# Altium footprint library NXP_60_26022015.PCBLIB: 287 footprints (part 18 of 18)
Each footprint in its own frame and in the unit in brackets; x right, y up, seen from the top. Pads: shape width x height; smd on the part's side, far side on the other; paste and mask are expansions set on the pad; w line width, h text height; cw(c..) or ccw(c..) is an arc to the next point about the centre after c.
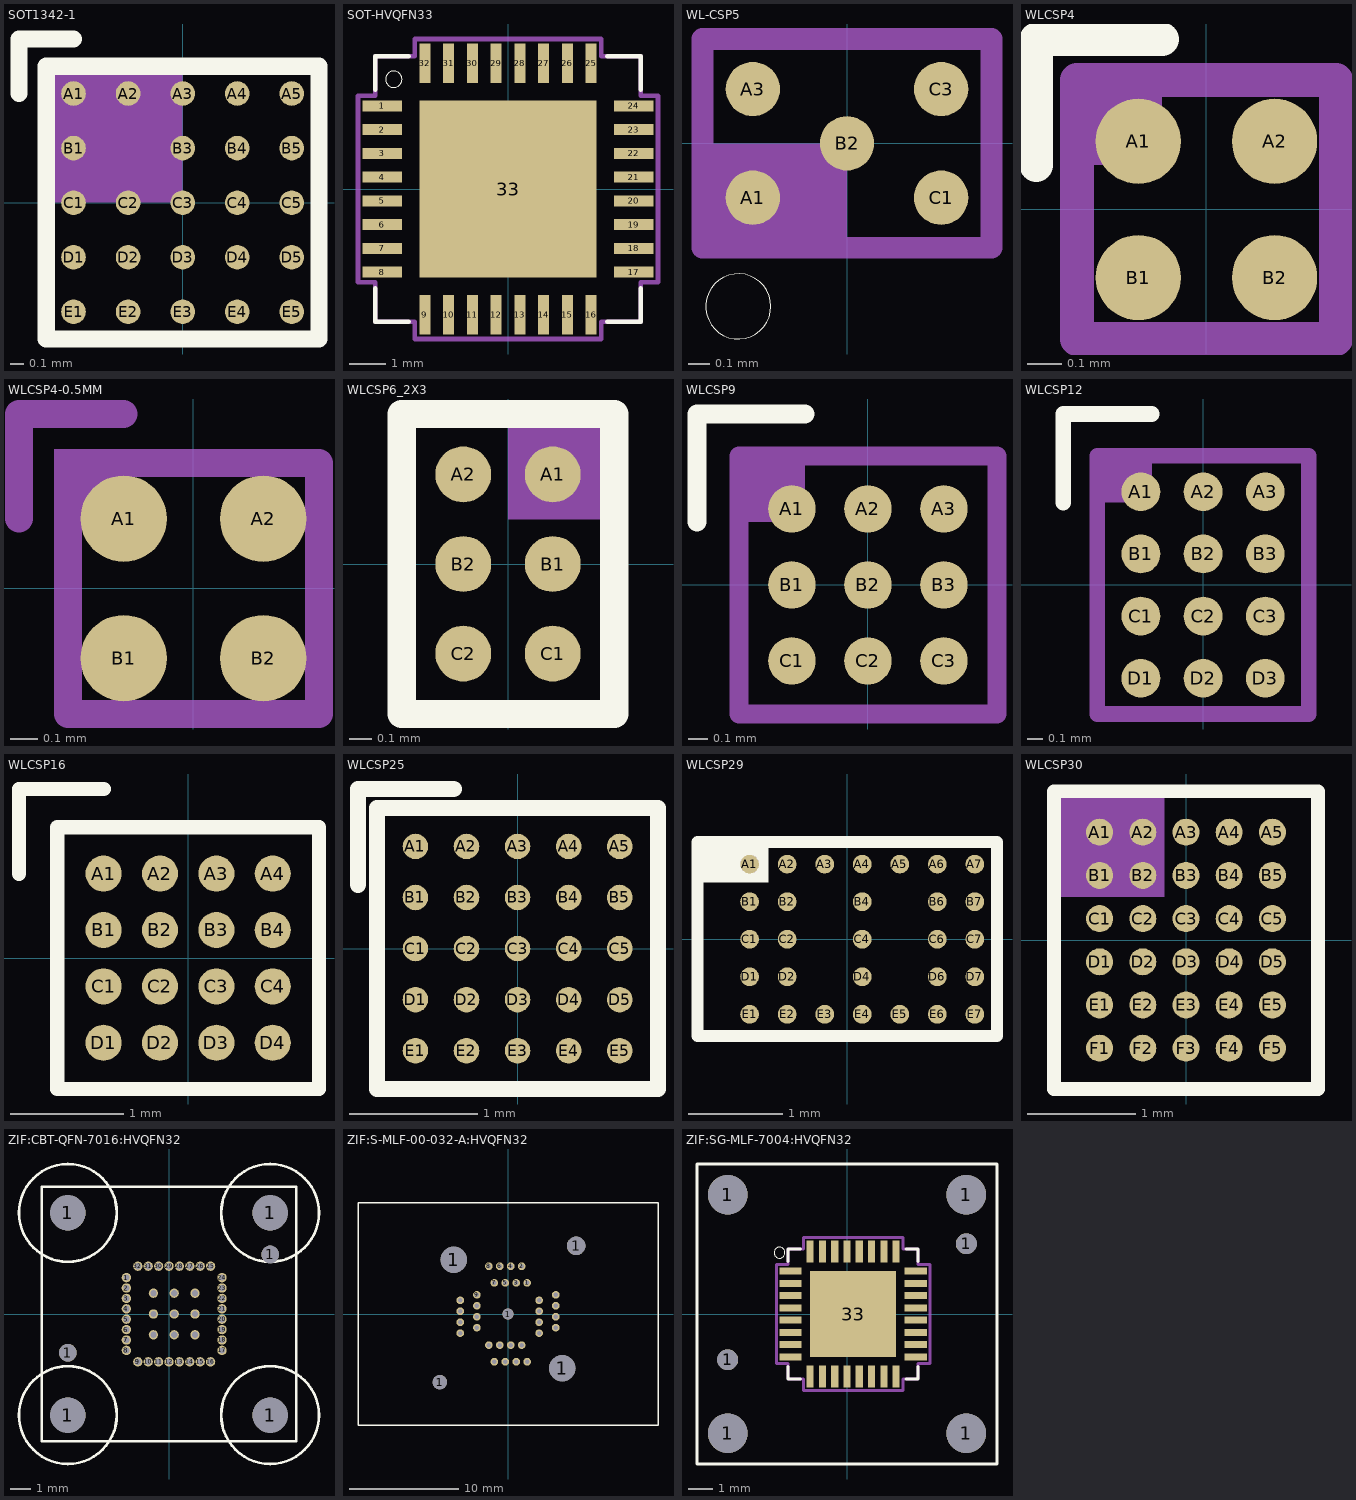
[diagram p17: the footprints below, top view; thin cyan lines are the x and y axes]

## SOT1342-1 [mil]
pads (24):
  rrect100% 7.09x7.09 smd: A1(-31.5,31.5) A2(-15.75,31.5) A3(0,31.5) A4(15.75,31.5) A5(31.5,31.5) B1(-31.5,15.75) B3(0,15.75) B4(15.75,15.75) B5(31.5,15.75) C1(-31.5,0) C2(-15.75,0) C3(0,0) C4(15.75,0) C5(31.5,0) D1(-31.5,-15.75) D2(-15.75,-15.75) D3(0,-15.75) D4(15.75,-15.75) D5(31.5,-15.75) E1(-31.5,-31.5) E2(-15.75,-31.5) E3(0,-31.5) E4(15.75,-31.5) E5(31.5,-31.5)
Top Overlay:
  lines w5: -47.24,31.5 -47.24,47.24 -31.5,47.24 ; -39.37,-39.37 39.37,-39.37 39.37,39.37 -39.37,39.37 -39.37,-39.37
Top Paste:
  circle w0: c-31.5,31.5 r3.94
  circle w0: c-31.5,15.75 r3.94
  circle w0: c-31.5,0 r3.94
  circle w0: c-31.5,-15.75 r3.94
  circle w0: c-31.5,-31.5 r3.94
  circle w0: c-15.75,31.5 r3.94
  circle w0: c-15.75,0 r3.94
  circle w0: c-15.75,-15.75 r3.94
  circle w0: c-15.75,-31.5 r3.94
  circle w0: c0,31.5 r3.94
  circle w0: c0,15.75 r3.94
  circle w0: c0,0 r3.94
  circle w0: c0,-15.75 r3.94
  circle w0: c0,-31.5 r3.94
  circle w0: c15.75,31.5 r3.94
  circle w0: c15.75,15.75 r3.94
  circle w0: c15.75,0 r3.94
  circle w0: c15.75,-15.75 r3.94
  circle w0: c15.75,-31.5 r3.94
  circle w0: c31.5,31.5 r3.94
  circle w0: c31.5,15.75 r3.94
  circle w0: c31.5,0 r3.94
  circle w0: c31.5,-15.75 r3.94
  circle w0: c31.5,-31.5 r3.94
Top Solder:
  circle w0: c-31.5,31.5 r4.92
  circle w0: c-31.5,15.75 r4.92
  circle w0: c-31.5,0 r4.92
  circle w0: c-31.5,-15.75 r4.92
  circle w0: c-31.5,-31.5 r4.92
  circle w0: c-15.75,31.5 r4.92
  circle w0: c-15.75,0 r4.92
  circle w0: c-15.75,-15.75 r4.92
  circle w0: c-15.75,-31.5 r4.92
  circle w0: c0,31.5 r4.92
  circle w0: c0,15.75 r4.92
  circle w0: c0,0 r4.92
  circle w0: c0,-15.75 r4.92
  circle w0: c0,-31.5 r4.92
  circle w0: c15.75,31.5 r4.92
  circle w0: c15.75,15.75 r4.92
  circle w0: c15.75,0 r4.92
  circle w0: c15.75,-15.75 r4.92
  circle w0: c15.75,-31.5 r4.92
  circle w0: c31.5,31.5 r4.92
  circle w0: c31.5,15.75 r4.92
  circle w0: c31.5,0 r4.92
  circle w0: c31.5,-15.75 r4.92
  circle w0: c31.5,-31.5 r4.92
Mechanical 16:
  rectangle: -39.37,0 0,39.37

## SOT-HVQFN33 [mm]
pads (33):
  rect 1.075x0.3 smd: 1(-3.437,2.275) 2(-3.437,1.625) 3(-3.437,0.975) 4(-3.437,0.325) 5(-3.437,-0.325) 6(-3.437,-0.975) 7(-3.437,-1.625) 8(-3.437,-2.275) 17(3.437,-2.275) 18(3.437,-1.625) 19(3.437,-0.975) 20(3.437,-0.325) 21(3.437,0.325) 22(3.437,0.975) 23(3.437,1.625) 24(3.437,2.275)
  rect 0.3x1.075 smd: 9(-2.275,-3.437) 10(-1.625,-3.437) 11(-0.975,-3.437) 12(-0.325,-3.437) 13(0.325,-3.437) 14(0.975,-3.437) 15(1.625,-3.437) 16(2.275,-3.437) 25(2.275,3.437) 26(1.625,3.437) 27(0.975,3.437) 28(0.325,3.437) 29(-0.325,3.437) 30(-0.975,3.437) 31(-1.625,3.437) 32(-2.275,3.437)
  rect 4.85x4.85 smd: 33(0,0)
Top Overlay:
  circle w0: c-3.12,3 r0.224
  lines w0.127: -3.625,-2.712 -3.625,-3.625 -2.712,-3.625 ; -3.625,2.712 -3.625,3.625 -2.712,3.625 ; 2.712,-3.625 3.625,-3.625 3.625,-2.712 ; 2.712,3.625 3.625,3.625 3.625,2.712
Top Paste:
  rectangle: 0.35,0.35 1.35,1.35
  rectangle: 0.35,-1.35 1.35,-0.35
  rectangle: -1.35,-1.35 -0.35,-0.35
  rectangle: -1.35,0.35 -0.35,1.35
Top Solder:
  rectangle: -2.525,-2.525 2.525,2.525
Mechanical 16:
  lines w0.127: -4.1,-2.55 -4.1,2.55 -3.625,2.55 -3.625,3.625 -2.55,3.625 -2.55,4.1 2.55,4.1 2.55,3.625 3.625,3.625 3.625,2.55 4.1,2.55 4.1,-2.55 3.625,-2.55 3.625,-3.625 2.55,-3.625 2.55,-4.1 -2.55,-4.1 -2.55,-3.625 -3.625,-3.625 -3.625,-2.55 -4.1,-2.55

## WL-CSP5 [mm]
pads (5):
  rrect100% 0.25x0.25 smd: A1(-0.433,-0.25) A3(-0.433,0.25) B2(0,0) C1(0.433,-0.25) C3(0.433,0.25)
Top Overlay:
  circle w0: c-0.5,-0.75 r0.15
Mechanical 16:
  rectangle: -0.665,-0.48 0,0
  lines w0.1: -0.665,-0.48 0.665,-0.48 0.665,0.48 -0.665,0.48 -0.665,-0.48

## WLCSP4 [mm]
pads (4):
  rrect100% 0.25x0.25 smd: A1(-0.2,0.2) A2(0.2,0.2) B1(-0.2,-0.2) B2(0.2,-0.2)
Top Overlay:
  lines w0.1: -0.5,0.13 -0.5,0.5 -0.13,0.5
Top Solder:
  circle w0: c-0.2,0.2 r0.163
  circle w0: c0.2,0.2 r0.163
  circle w0: c0.2,-0.2 r0.163
  circle w0: c-0.2,-0.2 r0.163
Mechanical 16:
  rectangle: -0.38,0.13 -0.13,0.38
  lines w0.1: -0.38,-0.38 0.38,-0.38 0.38,0.38 -0.38,0.38 -0.38,-0.38

## WLCSP4-0.5MM [mm]
pads (4):
  rrect100% 0.31x0.31 smd: A1(-0.25,0.25) A2(0.25,0.25) B1(-0.25,-0.25) B2(0.25,-0.25)
Top Solder:
  circle w0: c-0.25,0.25 r0.193
  circle w0: c0.25,0.25 r0.193
  circle w0: c0.25,-0.25 r0.193
  circle w0: c-0.25,-0.25 r0.193
Mechanical 16:
  rectangle: -0.5,0.25 -0.25,0.5
  lines w0.1: -0.625,0.25 -0.625,0.625 -0.25,0.625 ; -0.45,-0.45 0.45,-0.45 0.45,0.45 -0.45,0.45 -0.45,-0.45

## WLCSP6_2X3 [mm]
pads (6):
  rrect100% 0.25x0.25 smd: A1(0.2,0.4) A2(-0.2,0.4) B1(0.2,0) B2(-0.2,0) C1(0.2,-0.4) C2(-0.2,-0.4)
Top Overlay:
  lines w0.127: -0.475,-0.67 -0.475,0.67 0.475,0.67 0.475,-0.67 -0.475,-0.67
Top Solder:
  circle w0: c0.2,0.4 r0.163
  circle w0: c-0.2,0.4 r0.163
  circle w0: c0.2,0 r0.163
  circle w0: c-0.2,0 r0.163
  circle w0: c0.2,-0.4 r0.163
  circle w0: c-0.2,-0.4 r0.163
Mechanical 16:
  rectangle: 0,0.2 0.475,0.67

## WLCSP9 [mm]
pads (9):
  rrect100% 0.25x0.25 smd: A1(-0.4,0.4) A2(0,0.4) A3(0.4,0.4) B1(-0.4,0) B2(0,0) B3(0.4,0) C1(-0.4,-0.4) C2(0,-0.4) C3(0.4,-0.4)
Top Overlay:
  lines w0.1: -0.9,0.33 -0.9,0.9 -0.33,0.9
Top Solder:
  circle w0: c-0.4,0.4 r0.163
  circle w0: c0,0.4 r0.163
  circle w0: c0,0 r0.163
  circle w0: c-0.4,0 r0.163
  circle w0: c0.4,0.4 r0.163
  circle w0: c0.4,0 r0.163
  circle w0: c-0.4,-0.4 r0.163
  circle w0: c0,-0.4 r0.163
  circle w0: c0.4,-0.4 r0.163
Mechanical 16:
  rectangle: -0.68,0.33 -0.33,0.68
  lines w0.1: -0.68,-0.68 0.68,-0.68 0.68,0.68 -0.68,0.68 -0.68,-0.68

## WLCSP12 [mm]
pads (12):
  rrect100% 0.25x0.25 smd: A1(-0.4,0.6) A2(0,0.6) A3(0.4,0.6) B1(-0.4,0.2) B2(0,0.2) B3(0.4,0.2) C1(-0.4,-0.2) C2(0,-0.2) C3(0.4,-0.2) D1(-0.4,-0.6) D2(0,-0.6) D3(0.4,-0.6)
Top Overlay:
  lines w0.1: -0.9,0.53 -0.9,1.1 -0.33,1.1
Top Solder:
  circle w0: c-0.4,0.6 r0.163
  circle w0: c0,0.6 r0.163
  circle w0: c0,0.2 r0.163
  circle w0: c-0.4,0.2 r0.163
  circle w0: c0.4,0.6 r0.163
  circle w0: c0.4,0.2 r0.163
  circle w0: c-0.4,-0.2 r0.163
  circle w0: c0,-0.2 r0.163
  circle w0: c0.4,-0.2 r0.163
  circle w0: c-0.4,-0.6 r0.163
  circle w0: c0,-0.6 r0.163
  circle w0: c0.4,-0.6 r0.163
Mechanical 16:
  rectangle: -0.68,0.53 -0.33,0.88
  lines w0.1: -0.68,-0.83 0.68,-0.83 0.68,0.83 -0.68,0.83 -0.68,-0.83

## WLCSP16 [mm]
pads (16):
  rrect100% 0.32x0.32 smd: A1(-0.75,0.75) A2(-0.25,0.75) A3(0.25,0.75) A4(0.75,0.75) B1(-0.75,0.25) B2(-0.25,0.25) B3(0.25,0.25) B4(0.75,0.25) C1(-0.75,-0.25) C2(-0.25,-0.25) C3(0.25,-0.25) C4(0.75,-0.25) D1(-0.75,-0.75) D2(-0.25,-0.75) D3(0.25,-0.75) D4(0.75,-0.75)
Top Overlay:
  lines w0.127: -1.5,0.75 -1.5,1.5 -0.75,1.5 ; -1.16,-1.16 1.16,-1.16 1.16,1.16 -1.16,1.16 -1.16,-1.16
Top Solder:
  circle w0: c0.25,0.75 r0.15
  circle w0: c-0.75,-0.25 r0.15
  circle w0: c-0.75,-0.75 r0.15
  circle w0: c0.75,-0.25 r0.15
  circle w0: c-0.25,-0.75 r0.15
  circle w0: c0.25,0.25 r0.15
  circle w0: c-0.25,-0.25 r0.15
  circle w0: c0.75,0.25 r0.15
  circle w0: c0.25,-0.25 r0.15
  circle w0: c0.75,0.75 r0.15
  circle w0: c0.25,-0.75 r0.15
  circle w0: c0.75,-0.75 r0.15
  circle w0: c-0.75,0.75 r0.15
  circle w0: c-0.25,0.75 r0.15
  circle w0: c-0.25,0.25 r0.15
  circle w0: c-0.75,0.25 r0.15

## WLCSP25 [mil]
pads (25):
  rrect100% 7.87x7.87 smd: A1(-31.5,31.5) A2(-15.75,31.5) A3(0,31.5) A4(15.75,31.5) A5(31.5,31.5) B1(-31.5,15.75) B2(-15.75,15.75) B3(0,15.75) B4(15.75,15.75) B5(31.5,15.75) C1(-31.5,0) C2(-15.75,0) C3(0,0) C4(15.75,0) C5(31.5,0) D1(-31.5,-15.75) D2(-15.75,-15.75) D3(0,-15.75) D4(15.75,-15.75) D5(31.5,-15.75) E1(-31.5,-31.5) E2(-15.75,-31.5) E3(0,-31.5) E4(15.75,-31.5) E5(31.5,-31.5)
Top Overlay:
  lines w5: -49.21,19.69 -49.21,49.21 -19.69,49.21 ; -43.31,-43.31 43.31,-43.31 43.31,43.31 -43.31,43.31 -43.31,-43.31
Top Solder:
  circle w0: c-31.5,31.5 r4.92
  circle w0: c-31.5,15.75 r4.92
  circle w0: c-31.5,0 r4.92
  circle w0: c-31.5,-15.75 r4.92
  circle w0: c-31.5,-31.5 r4.92
  circle w0: c-15.75,31.5 r4.92
  circle w0: c-15.75,15.75 r4.92
  circle w0: c-15.75,0 r4.92
  circle w0: c-15.75,-15.75 r4.92
  circle w0: c-15.75,-31.5 r4.92
  circle w0: c0,31.5 r4.92
  circle w0: c0,15.75 r4.92
  circle w0: c0,0 r4.92
  circle w0: c0,-15.75 r4.92
  circle w0: c0,-31.5 r4.92
  circle w0: c15.75,31.5 r4.92
  circle w0: c15.75,15.75 r4.92
  circle w0: c15.75,0 r4.92
  circle w0: c15.75,-15.75 r4.92
  circle w0: c15.75,-31.5 r4.92
  circle w0: c31.5,31.5 r4.92
  circle w0: c31.5,15.75 r4.92
  circle w0: c31.5,0 r4.92
  circle w0: c31.5,-15.75 r4.92
  circle w0: c31.5,-31.5 r4.92

## WLCSP29 [mm]
pads (29):
  rrect100% 0.2x0.2 smd: A1(-1.04,0.798) A2(-0.64,0.798) A3(-0.24,0.798) A4(0.161,0.798) A5(0.561,0.798) A6(0.961,0.798) A7(1.36,0.798) B1(-1.04,0.398) B2(-0.64,0.398) B4(0.161,0.398) B6(0.961,0.398) B7(1.36,0.398) C1(-1.04,-0.003) C2(-0.64,-0.003) C4(0.161,-0.003) C6(0.961,-0.003) C7(1.36,-0.003) D1(-1.04,-0.403) D2(-0.64,-0.403) D4(0.161,-0.403) D6(0.961,-0.403) D7(1.36,-0.403) E1(-1.04,-0.802) E2(-0.64,-0.802) E3(-0.24,-0.802) E4(0.161,-0.802) E5(0.561,-0.802) E6(0.961,-0.802) E7(1.36,-0.802)
Top Overlay:
  rectangle: -1.6,0.6 -0.84,1
  lines w0.127: -1.596,-1.036 1.596,-1.036 1.596,1.036 -1.596,1.036 -1.596,-1.036
Top Solder:
  circle w0: c-1.04,0.798 r0.125
  circle w0: c-0.24,0.798 r0.125
  circle w0: c-0.64,0.798 r0.125
  circle w0: c0.161,0.798 r0.125
  circle w0: c0.961,0.798 r0.125
  circle w0: c1.36,0.798 r0.125
  circle w0: c-0.64,0.398 r0.125
  circle w0: c-1.04,0.398 r0.125
  circle w0: c-1.04,-0.003 r0.125
  circle w0: c-0.64,-0.003 r0.125
  circle w0: c-0.64,-0.403 r0.125
  circle w0: c-1.04,-0.403 r0.125
  circle w0: c-1.04,-0.802 r0.125
  circle w0: c-0.64,-0.802 r0.125
  circle w0: c-0.24,-0.802 r0.125
  circle w0: c0.161,-0.802 r0.125
  circle w0: c0.561,-0.802 r0.125
  circle w0: c0.961,-0.802 r0.125
  circle w0: c1.36,-0.802 r0.125
  circle w0: c0.161,0.398 r0.125
  circle w0: c0.161,-0.003 r0.125
  circle w0: c0.161,-0.403 r0.125
  circle w0: c0.961,0.398 r0.125
  circle w0: c0.961,-0.003 r0.125
  circle w0: c0.961,-0.403 r0.125
  circle w0: c1.36,0.398 r0.125
  circle w0: c1.36,-0.003 r0.125
  circle w0: c1.36,-0.403 r0.125
  circle w0: c0.561,0.798 r0.125

## WLCSP30 [mil]
pads (30):
  rrect100% 9.84x9.84 smd: A1(-31.5,39.37) A2(-15.75,39.37) A3(0,39.37) A4(15.75,39.37) A5(31.5,39.37) B1(-31.5,23.62) B2(-15.75,23.62) B3(0,23.62) B4(15.75,23.62) B5(31.5,23.62) C1(-31.5,7.87) C2(-15.75,7.87) C3(0,7.87) C4(15.75,7.87) C5(31.5,7.87) D1(-31.5,-7.87) D2(-15.75,-7.87) D3(0,-7.87) D4(15.75,-7.87) D5(31.5,-7.87) E1(-31.5,-23.62) E2(-15.75,-23.62) E3(0,-23.62) E4(15.75,-23.62) E5(31.5,-23.62) F1(-31.5,-39.37) F2(-15.75,-39.37) F3(0,-39.37) F4(15.75,-39.37) F5(31.5,-39.37)
Top Overlay:
  lines w5: -48.11,-54.25 48.11,-54.25 48.11,54.25 -48.11,54.25 -48.11,-54.25
Mechanical 16:
  rectangle: -47.24,15.75 -7.87,55.12

## ZIF:CBT-QFN-7016:HVQFN32 [mm]
pads (47):
  round 1.7 hole 1.7: 1(-4.863,-4.863) 1(-4.863,4.863) 1(4.863,-4.863) 1(4.863,4.863)
  round 0.85 hole 0.85: 1(-4.863,-1.863) 1(4.863,2.863)
  round 0.45 hole 0.3: 1(-2.05,1.75) 2(-2.05,1.25) 3(-2.05,0.75) 4(-2.05,0.25) 5(-2.05,-0.25) 6(-2.05,-0.75) 7(-2.05,-1.25) 8(-2.05,-1.75) 9(-1.5,-2.3) 10(-1,-2.3) 11(-0.5,-2.3) 12(0,-2.3) 13(0.5,-2.3) 14(1,-2.3) 15(1.5,-2.3) 16(2,-2.3) 17(2.55,-1.75) 18(2.55,-1.25) 19(2.55,-0.75) 20(2.55,-0.25) 21(2.55,0.25) 22(2.55,0.75) 23(2.55,1.25) 24(2.55,1.75) 25(2,2.3) 26(1.5,2.3) 27(1,2.3) 28(0.5,2.3) 29(0,2.3) 30(-0.5,2.3) 31(-1,2.3) 32(-1.5,2.3) CP@1(1.25,1) CP@2(0.25,1) CP@3(-0.75,1) CP@4(1.25,0) CP@5(0.25,0) CP@6(-0.75,0) CP@7(1.25,-1) CP@8(0.25,-1) CP@9(-0.75,-1)
Top Overlay:
  circle w0.127: c-4.863,-4.863 r2.351
  circle w0.127: c-4.863,4.863 r2.351
  circle w0.127: c4.863,4.863 r2.351
  circle w0.127: c4.863,-4.863 r2.351
  lines w0.127: -6.113,-6.113 6.113,-6.113 6.113,6.113 -6.113,6.113 -6.113,-6.113
Top Solder:
  circle w0: c-4.863,-4.863 r2.351
  circle w0: c-4.863,4.863 r2.351
  circle w0: c4.863,4.863 r2.351
  circle w0: c4.863,-4.863 r2.351

## ZIF:S-MLF-00-032-A:HVQFN32 [mm]
pads (37):
  round 1.32 hole 1.32: 1(-6.225,-6.225)
  round 2.39 hole 2.39: 1(-4.955,4.955) 1(4.955,-4.955)
  round 1.02 hole 1.02: 1(0,0)
  round 0.7 hole 0.41: 1(1.75,2.845) 2(1.25,4.37) 3(0.75,2.845) 4(0.25,4.37) 5(-0.25,2.845) 6(-0.75,4.37) 7(-1.25,2.845) 8(-1.75,4.37) 9(-2.845,1.75) 10(-4.37,1.25) 11(-2.845,0.75) 12(-4.37,0.25) 13(-2.845,-0.25) 14(-4.37,-0.75) 15(-2.845,-1.25) 16(-4.37,-1.75) 17(-1.75,-2.845) 18(-1.25,-4.37) 19(-0.75,-2.845) 20(-0.25,-4.37) 21(0.25,-2.845) 22(0.75,-4.37) 23(1.25,-2.845) 24(1.75,-4.37) 25(2.845,-1.75) 26(4.37,-1.25) 27(2.845,-0.75) 28(4.37,-0.25) 29(2.845,0.25) 30(4.37,0.75) 31(2.845,1.25) 32(4.37,1.75)
  round 1.7 hole 1.7: 1(6.225,6.225)
Top Overlay:
  lines w0.127: -13.715,-10.16 13.715,-10.16 13.715,10.16 -13.715,10.16 -13.715,-10.16

## ZIF:SG-MLF-7004:HVQFN32 [mm]
pads (39):
  round 1.61 hole 1.61: 1(-4.863,-4.863) 1(-4.863,4.863) 1(4.863,-4.863) 1(4.863,4.863)
  round 0.85 hole 0.85: 1(-4.863,-1.863) 1(4.863,2.863)
  rect 0.9x0.29 smd: 1(-2.3,1.75) 2(-2.3,1.25) 3(-2.3,0.75) 4(-2.3,0.25) 5(-2.3,-0.25) 6(-2.3,-0.75) 7(-2.3,-1.25) 8(-2.3,-1.75) 17(2.8,-1.75) 18(2.8,-1.25) 19(2.8,-0.75) 20(2.8,-0.25) 21(2.8,0.25) 22(2.8,0.75) 23(2.8,1.25) 24(2.8,1.75)
  rect 0.29x0.9 smd: 9(-1.5,-2.55) 10(-1,-2.55) 11(-0.5,-2.55) 12(0,-2.55) 13(0.5,-2.55) 14(1,-2.55) 15(1.5,-2.55) 16(2,-2.55) 25(2,2.55) 26(1.5,2.55) 27(1,2.55) 28(0.5,2.55) 29(0,2.55) 30(-0.5,2.55) 31(-1,2.55) 32(-1.5,2.55)
  rect 3.5x3.5 smd: 33(0.25,0)
Top Overlay:
  circle w0: c-2.75,2.5 r0.224
  lines w0.127: -2.4,-2.15 -2.4,-2.65 -1.9,-2.65 ; -2.4,2.15 -2.4,2.65 -1.9,2.65 ; 2.4,-2.65 2.9,-2.65 2.9,-2.15 ; 2.4,2.65 2.9,2.65 2.9,2.15 ; -6.113,-6.113 6.113,-6.113 6.113,6.113 -6.113,6.113 -6.113,-6.113
Top Paste:
  rectangle: 0,-0.25 0.5,0.25
  rectangle: -0.8,-0.25 -0.3,0.25
  rectangle: 0.8,-0.25 1.3,0.25
  rectangle: 0,0.55 0.5,1.05
  rectangle: 0,-1.05 0.5,-0.55
  rectangle: 0.8,0.55 1.3,1.05
  rectangle: -0.8,0.55 -0.3,1.05
  rectangle: -0.8,-1.05 -0.3,-0.55
  rectangle: 0.8,-1.05 1.3,-0.55
Mechanical 16:
  lines w0.127: -2.875,-2.025 -2.875,2.025 -2.4,2.025 -2.4,2.65 -1.775,2.65 -1.775,3.125 2.275,3.125 2.275,2.65 2.9,2.65 2.9,2.025 3.375,2.025 3.375,-2.025 2.9,-2.025 2.9,-2.65 2.275,-2.65 2.275,-3.125 -1.775,-3.125 -1.775,-2.65 -2.4,-2.65 -2.4,-2.025 -2.875,-2.025